# Altium footprint library jetson-nano-baseboard.PcbLib: 45 footprints (part 1 of 3)
Each footprint in its own frame and in the unit in brackets; x right, y up, seen from the top. Pads: shape width x height; smd on the part's side, far side on the other; paste and mask are expansions set on the pad; w line width, h text height; cw(c..) or ccw(c..) is an arc to the next point about the centre after c.
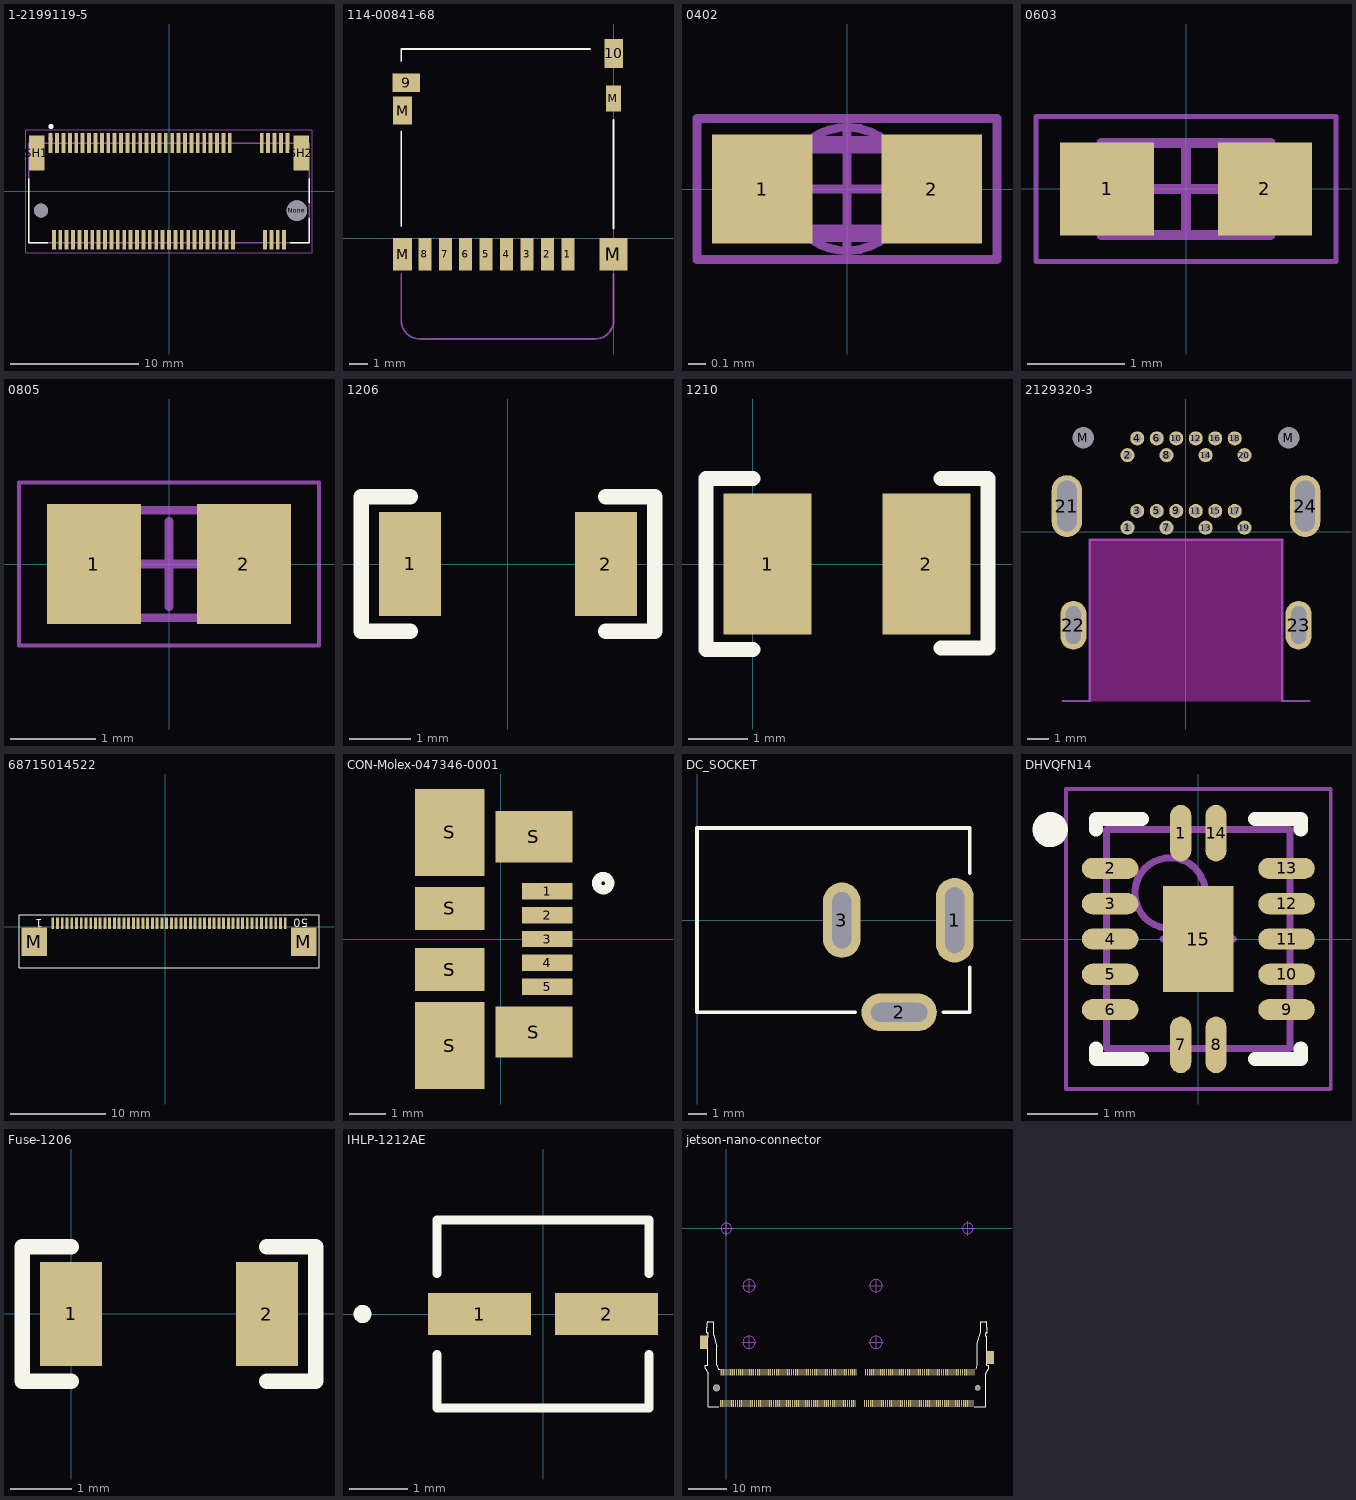
[diagram p0: the footprints below, top view; thin cyan lines are the x and y axes]

## 1-2199119-5 [mm]
pads (71):
  rect 0.3x1.55 smd: 1(-9.25,3.775) 2(-9,-3.775) 3(-8.75,3.775) 4(-8.5,-3.775) 5(-8.25,3.775) 6(-8,-3.775) 7(-7.75,3.775) 8(-7.5,-3.775) 9(-7.25,3.775) 10(-7,-3.775) 11(-6.75,3.775) 12(-6.5,-3.775) 13(-6.25,3.775) 14(-6,-3.775) 15(-5.75,3.775) 16(-5.5,-3.775) 17(-5.25,3.775) 18(-5,-3.775) 19(-4.75,3.775) 20(-4.5,-3.775) 21(-4.25,3.775) 22(-4,-3.775) 23(-3.75,3.775) 24(-3.5,-3.775) 25(-3.25,3.775) 26(-3,-3.775) 27(-2.75,3.775) 28(-2.5,-3.775) 29(-2.25,3.775) 30(-2,-3.775) 31(-1.75,3.775) 32(-1.5,-3.775) 33(-1.25,3.775) 34(-1,-3.775) 35(-0.75,3.775) 36(-0.5,-3.775) 37(-0.25,3.775) 38(0,-3.775) 39(0.25,3.775) 40(0.5,-3.775) 41(0.75,3.775) 42(1,-3.775) 43(1.25,3.775) 44(1.5,-3.775) 45(1.75,3.775) 46(2,-3.775) 47(2.25,3.775) 48(2.5,-3.775) 49(2.75,3.775) 50(3,-3.775) 51(3.25,3.775) 52(3.5,-3.775) 53(3.75,3.775) 54(4,-3.775) 55(4.25,3.775) 56(4.5,-3.775) 57(4.75,3.775) 58(5,-3.775) 67(7.25,3.775) 68(7.5,-3.775) 69(7.75,3.775) 70(8,-3.775) 71(8.25,3.775) 72(8.5,-3.775) 73(8.75,3.775) 74(9,-3.775) 75(9.25,3.775)
  round 1.1 hole 1.1 unplated: None(-10,-1.5)
  round 1.6 hole 1.6 unplated: None(10,-1.5)
  rect 1.2x2.75 smd: SH1(-10.35,3) SH2(10.35,3)
Top Overlay:
  circle w0.2: c-9.225,5.075 r0.1
  lines w0.127: -10.95,1 -10.95,-4 -9.5,-4 ; 9.5,-4 10.95,-4 10.95,-2.1 ; 10.95,-0.9 10.95,1
Mechanical 4:
  circle w0.2: c-9.25,4.115 r0.1
  circle w0.2: c-9.25,4.115 r0.1
  lines w0.127: -10.95,-4 -10.95,3.75 ; -10.95,-4 10.95,-4 ; -10.95,-4 -10.95,3.75 ; -10.95,-4 10.95,-4 ; -10.95,3.75 10.95,3.75 ; -10.95,3.75 10.95,3.75 ; 10.95,-4 10.95,3.75 ; 10.95,-4 10.95,3.75
Mechanical 16:
  lines w0.05: -11.2,-4.8 -11.2,4.8 11.2,4.8 11.2,-4.8 -11.2,-4.8
3D body: height 3.09, standoff -0.54, extent -10.97,-4.36 10.93,4.34

## 114-00841-68 [mm]
pads (14):
  rect 0.7x1.75 smd: 1(-2.455,-0.874) 2(-3.555,-0.874) 3(-4.655,-0.874) 4(-5.755,-0.874) 5(-6.855,-0.874) 6(-7.955,-0.874) 7(-9.055,-0.874) 8(-10.155,-0.874)
  rect 1.5x1 smd: 9(-11.155,8.365)
  rect 1x1.55 smd: 10(0.005,9.94)
  rect 1x1.75 smd: M(-11.355,-0.874)
  rect 1x1.5 smd: M(-11.355,6.865)
  rect 1.5x1.75 smd: M(-0.005,-0.874)
  rect 0.8x1.4 smd: M(-0.005,7.515)
Top Overlay:
  lines w0.1: -11.425,0.65 -11.425,5.73 ; -11.425,9.54 -11.425,10.175 -1.265,10.175 ; 0.005,0.523 0.005,6.365
Mechanical 3:
  lines w0.1: -11.425,-1.925 -11.425,-4.425 ccw(c-10.425,-4.425) -10.425,-5.425 -1,-5.425 ccw(c-1,-4.425) 0,-4.425 0,-1.925
  text "Micro SD Card" at -10.15,-4.075 h0.7
3D body: height 1.6, standoff 0, extent -11.628,-1.382 0.372,10.218

## 0402 [mm]
height 0.35
pads (2):
  rect 0.57x0.62 smd: 1(-0.48,0) 2(0.48,0)
Mechanical 3:
  circle w0.05: c0,0 r0.35
  lines w0.05: -0.5,0 0.5,0 ; 0,-0.4 0,0.4 ; -0.85,-0.4 -0.85,0.4 0.85,0.4 0.85,-0.4 -0.85,-0.4
Mechanical 13:
  lines w0.1: -0.5,-0.25 -0.5,0.25 0.5,0.25 0.5,-0.25 -0.5,-0.25
3D body: height 0.35, standoff 0, extent -0.472,-0.25 0.528,0.25

## 0603 [mm] "Chip Inductor Ferrite Bead 0603"
height 0.6
pads (2):
  rect 0.97x0.96 smd: 1(-0.815,0) 2(0.815,0)
Mechanical 13:
  lines w0.1: -0.875,-0.475 0.875,-0.475 0.875,0.475 -0.875,0.475 -0.875,-0.475
Mechanical 15:
  lines w0.05: -1.55,-0.75 1.55,-0.75 1.55,0.75 -1.55,0.75 -1.55,-0.75
  lines w0.1: -0.475,0 0.475,0 ; 0,-0.475 0,0.475
3D body: height 0.6, standoff 0, extent 0.475,-0.475 0.875,0.475
3D body: height 0.6, standoff 0, extent -0.875,-0.475 -0.475,0.475
3D body: height 0.6, standoff 0, extent -0.475,-0.475 0.475,0.475

## 0805 [mm]
pads (2):
  rect 1.1x1.4 smd: 1(-0.875,0) 2(0.875,0)
Mechanical 13:
  lines w0.1: -1,-0.625 1,-0.625 1,0.625 -1,0.625 -1,-0.625
Mechanical 15:
  lines w0.05: -1.75,-0.95 1.75,-0.95 1.75,0.95 -1.75,0.95 -1.75,-0.95
  lines w0.1: -0.5,0 0.5,0 ; 0,-0.5 0,0.5
3D body: height 0.45, standoff 0, extent 1,-0.625 1,0.625
3D body: height 0.45, standoff 0, extent -1,-0.625 -1,0.625
3D body: height 0.78, standoff 0, extent -1,-0.625 1,0.625

## 1206 [mm]
pads (2):
  rect 1.016x1.7 smd: 1(-1.6,0) 2(1.6,0)
Top Overlay:
  lines w0.254: -1.6,-1.1 -2.4,-1.1 -2.4,1.1 -1.6,1.1 ; 1.6,-1.1 2.4,-1.1 2.4,1.1 1.6,1.1
3D body: height 0.61, standoff -0.01, extent -1.627,-0.787 1.577,0.838

## 1210 [mm]
pads (2):
  rect 1.5x2.4 smd: 1(0.25,0) 2(2.95,0)
Top Overlay:
  lines w0.254: 0,-1.45 -0.8,-1.45 -0.8,1.45 0,1.45 ; 3.2,-1.425 4,-1.425 4,1.45 3.2,1.45
3D body: height 1.3, standoff -1.3, extent -0.125,-0.75 3.275,0.75

## 2129320-3 [mm]
pads (26):
  round 0.65 hole 0.4 unplated: 1(-2.7,0.175) 2(-2.7,3.525) 3(-2.25,0.95) 4(-2.25,4.3) 5(-1.35,0.95) 6(-1.35,4.3) 7(-0.9,0.175) 8(-0.9,3.525) 9(-0.45,0.95) 10(-0.45,4.3) 11(0.45,0.95) 12(0.45,4.3) 13(0.908,0.175) 14(0.908,3.525) 15(1.35,0.95) 16(1.35,4.3) 17(2.25,0.95) 18(2.25,4.3) 19(2.7,0.175) 20(2.7,3.525)
  oval 1.4x2.85 hole 0.9 slot 2.35 at 90 deg: 21(-5.5,1.175) 24(5.5,1.175)
  oval 1.2x2.25 hole 0.7 slot 1.74 at 90 deg: 22(-5.2,-4.325) 23(5.2,-4.325)
  round 0.75 hole 1: M(-4.75,4.325) M(4.75,4.325)
Keep-Out Layer:
  board cut-out: -4.445,-0.381 4.445,-0.381 4.445,-7.825 -4.445,-7.825
Mechanical 1:
  lines w0.1: -5.7,-7.825 -5.2,-7.825 -4.445,-7.825 -4.445,-0.381 4.445,-0.381 4.445,-7.825 5.2,-7.825 5.7,-7.825
  text "PCB edge" at -2.921,-9.144 h0.76
3D body: height 4.18, standoff -2.22, extent -5.7,-7.825 5.7,4.825

## 68715014522 [mm] "50 pins"
height 2.1
pads (52):
  rect 0.3x1.2 smd: 1(-11.865,0.381) 2(-11.365,0.381) 3(-10.865,0.381) 4(-10.365,0.381) 5(-9.865,0.381) 6(-9.365,0.381) 7(-8.865,0.381) 8(-8.365,0.381) 9(-7.865,0.381) 10(-7.365,0.381) 11(-6.865,0.381) 12(-6.365,0.381) 13(-5.865,0.381) 14(-5.365,0.381) 15(-4.865,0.381) 16(-4.365,0.381) 17(-3.865,0.381) 18(-3.365,0.381) 19(-2.865,0.381) 20(-2.365,0.381) 21(-1.865,0.381) 22(-1.365,0.381) 23(-0.865,0.381) 24(-0.365,0.381) 25(0.135,0.381) 26(0.635,0.381) 27(1.135,0.381) 28(1.635,0.381) 29(2.135,0.381) 30(2.635,0.381) 31(3.135,0.381) 32(3.635,0.381) 33(4.135,0.381) 34(4.635,0.381) 35(5.135,0.381) 36(5.635,0.381) 37(6.135,0.381) 38(6.635,0.381) 39(7.135,0.381) 40(7.635,0.381) 41(8.135,0.381) 42(8.635,0.381) 43(9.135,0.381) 44(9.635,0.381) 45(10.135,0.381) 46(10.635,0.381) 47(11.135,0.381) 48(11.635,0.381) 49(12.135,0.381) 50(12.635,0.381)
  rect 2.7x3 smd: M(-13.795,-1.599) M(14.565,-1.599)
Top Overlay:
  lines w0.127: -15.415,-4.319 -15.415,1.281 16.185,1.281 16.185,-4.319 -15.415,-4.319
  text "1" at -12.919,0.775 h0.9
  text "50" at 15.072,0.826 h0.9
3D body: height 2.06, standoff -0.04, extent -15.319,-4.324 16.081,0.776

## CON-Molex-047346-0001 [mm]
pads (11):
  rect 1.38x0.45 smd: 1(1.263,1.3) 2(1.263,0.65) 3(1.263,0) 4(1.263,-0.65) 5(1.263,-1.3)
  rect 1.9x2.37 smd: S(-1.397,-2.91) S(-1.397,2.91)
  rect 1.9x1.175 smd: S(-1.397,-0.837) S(-1.397,0.837)
  rect 2.1x1.4 smd: S(0.903,-2.54) S(0.903,2.794)
Top Overlay:
  circle w0.254: c2.794,1.524 r0.18
3D body: height 2.71, standoff -0.23, extent -3.796,-3.99 1.634,3.99

## DC_SOCKET [mm]
height 11
pads (3):
  oval 2x4.5 hole 1 slot 3.5 at 90 deg: 1(13.7,0)
  oval 4x2 hole 1 slot 3 at 0 deg: 2(10.75,-4.9)
  oval 2x4 hole 1 slot 3 at 90 deg: 3(7.7,0)
Top Overlay:
  lines w0.2: 8.4,-4.9 0,-4.9 0,4.9 14.5,4.9 14.5,2.5 ; 13.1,-4.9 14.5,-4.9 14.5,-2.5
3D body: height 11.01, standoff -3.49, extent 0,-5.1 14.1,4.5

## DHVQFN14 [mm] "QFN, 14-Leads, Body 2.50x3.00mm, Pitch 0.50mm, Thermal Pad 1.00x1.50mm, IPC Medium Density"
height 1
pads (15):
  oval 0.3x0.8 smd: 1(-0.25,1.5) 7(-0.25,-1.5) 8(0.25,-1.5) 14(0.25,1.5)
  oval 0.8x0.3 smd: 2(-1.25,1) 3(-1.25,0.5) 4(-1.25,0) 5(-1.25,-0.5) 6(-1.25,-1) 9(1.25,-1) 10(1.25,-0.5) 11(1.25,0) 12(1.25,0.5) 13(1.25,1)
  rect 1x1.5 smd: 15(0,0)
Top Overlay:
  circle w0.25: c-2.1,1.55 r0.125
  lines w0.2: -1.45,-1.55 -1.45,-1.7 -0.8,-1.7 ; -1.45,1.55 -1.45,1.7 -0.8,1.7 ; 0.8,-1.7 1.45,-1.7 1.45,-1.55 ; 0.8,1.7 1.45,1.7 1.45,1.55
Mechanical 13:
  circle w0.1: c-0.4,0.65 r0.5
  lines w0.1: -1.3,-1.55 -1.3,1.55 1.3,1.55 1.3,-1.55 -1.3,-1.55
Mechanical 15:
  lines w0.05: -1.875,-2.125 -1.875,2.125 1.875,2.125 1.875,-2.125 -1.875,-2.125
  lines w0.1: -0.5,0 0.5,0 ; 0,-0.5 0,0.5
3D body: height 0.85, standoff -0.02, extent -1.252,-1.501 1.25,1.501

## Fuse-1206 [mm]
pads (2):
  rect 1.016x1.7 smd: 1(0,0) 2(3.2,0)
Top Overlay:
  lines w0.254: 0,-1.1 -0.8,-1.1 -0.8,1.1 0,1.1 ; 3.2,-1.1 4,-1.1 4,1.1 3.2,1.1
3D body: height 1.43, standoff -0.03, extent -0.026,-0.825 3.176,0.827

## IHLP-1212AE [mil]
pads (2):
  rect 69x28 smd: 1(-42.5,0) 2(42.5,0)
Top Overlay:
  circle w6: c-121,0 r3
  lines w6: -71,-27.1 -71,-63 71,-63 71,-27.1 ; -71,27.1 -71,63 71,63 71,27.1
3D body: height 61, standoff 0, extent -71,-63 71,63

## jetson-nano-connector [mm]
pads (264):
  rect 0.3x1.75 smd: 1(-1.575,-46.1) 2(-1.325,-37.9) 3(-1.075,-46.1) 4(-0.825,-37.9) 5(-0.575,-46.1) 6(-0.325,-37.9) 7(-0.075,-46.1) 8(0.175,-37.9) 9(0.425,-46.1) 10(0.675,-37.9) 11(0.925,-46.1) 12(1.175,-37.9) 13(1.425,-46.1) 14(1.675,-37.9) 15(1.925,-46.1) 16(2.175,-37.9) 17(2.425,-46.1) 18(2.675,-37.9) 19(2.925,-46.1) 20(3.175,-37.9) 21(3.425,-46.1) 22(3.675,-37.9) 23(3.925,-46.1) 24(4.175,-37.9) 25(4.425,-46.1) 26(4.675,-37.9) 27(4.925,-46.1) 28(5.175,-37.9) 29(5.425,-46.1) 30(5.675,-37.9) 31(5.925,-46.1) 32(6.175,-37.9) 33(6.425,-46.1) 34(6.675,-37.9) 35(6.925,-46.1) 36(7.175,-37.9) 37(7.425,-46.1) 38(7.675,-37.9) 39(7.925,-46.1) 40(8.175,-37.9) 41(8.425,-46.1) 42(8.675,-37.9) 43(8.925,-46.1) 44(9.175,-37.9) 45(9.425,-46.1) 46(9.675,-37.9) 47(9.925,-46.1) 48(10.175,-37.9) 49(10.425,-46.1) 50(10.675,-37.9) 51(10.925,-46.1) 52(11.175,-37.9) 53(11.425,-46.1) 54(11.675,-37.9) 55(11.925,-46.1) 56(12.175,-37.9) 57(12.425,-46.1) 58(12.675,-37.9) 59(12.925,-46.1) 60(13.175,-37.9) 61(13.425,-46.1) 62(13.675,-37.9) 63(13.925,-46.1) 64(14.175,-37.9) 65(14.425,-46.1) 66(14.675,-37.9) 67(14.925,-46.1) 68(15.175,-37.9) 69(15.425,-46.1) 70(15.675,-37.9) 71(15.925,-46.1) 72(16.175,-37.9) 73(16.425,-46.1) 74(16.675,-37.9) 75(16.925,-46.1) 76(17.175,-37.9) 77(17.425,-46.1) 78(17.675,-37.9) 79(17.925,-46.1) 80(18.175,-37.9) 81(18.425,-46.1) 82(18.675,-37.9) 83(18.925,-46.1) 84(19.175,-37.9) 85(19.425,-46.1) 86(19.675,-37.9) 87(19.925,-46.1) 88(20.175,-37.9) 89(20.425,-46.1) 90(20.675,-37.9) 91(20.925,-46.1) 92(21.175,-37.9) 93(21.425,-46.1) 94(21.675,-37.9) 95(21.925,-46.1) 96(22.175,-37.9) 97(22.425,-46.1) 98(22.675,-37.9) 99(22.925,-46.1) 100(23.175,-37.9) 101(23.425,-46.1) 102(23.675,-37.9) 103(23.925,-46.1) 104(24.175,-37.9) 105(24.425,-46.1) 106(24.675,-37.9) 107(24.925,-46.1) 108(25.175,-37.9) 109(25.425,-46.1) 110(25.675,-37.9) 111(25.925,-46.1) 112(26.175,-37.9) 113(26.425,-46.1) 114(26.675,-37.9) 115(26.925,-46.1) 116(27.175,-37.9) 117(27.425,-46.1) 118(27.675,-37.9) 119(27.925,-46.1) 120(28.175,-37.9) 121(28.425,-46.1) 122(28.675,-37.9) 123(28.925,-46.1) 124(29.175,-37.9) 125(29.425,-46.1) 126(29.675,-37.9) 127(29.925,-46.1) 128(30.175,-37.9) 129(30.425,-46.1) 130(30.675,-37.9) 131(30.925,-46.1) 132(31.175,-37.9) 133(31.425,-46.1) 134(31.675,-37.9) 135(31.925,-46.1) 136(32.175,-37.9) 137(32.425,-46.1) 138(32.675,-37.9) 139(32.925,-46.1) 140(33.175,-37.9) 141(33.425,-46.1) 142(33.675,-37.9) 143(33.925,-46.1) 144(34.175,-37.9) 145(36.425,-46.1) 146(36.675,-37.9) 147(36.925,-46.1) 148(37.175,-37.9) 149(37.425,-46.1) 150(37.675,-37.9) 151(37.925,-46.1) 152(38.175,-37.9) 153(38.425,-46.1) 154(38.675,-37.9) 155(38.925,-46.1) 156(39.175,-37.9) 157(39.425,-46.1) 158(39.675,-37.9) 159(39.925,-46.1) 160(40.175,-37.9) 161(40.425,-46.1) 162(40.675,-37.9) 163(40.925,-46.1) 164(41.175,-37.9) 165(41.425,-46.1) 166(41.675,-37.9) 167(41.925,-46.1) 168(42.175,-37.9) 169(42.425,-46.1) 170(42.675,-37.9) 171(42.925,-46.1) 172(43.175,-37.9) 173(43.425,-46.1) 174(43.675,-37.9) 175(43.925,-46.1) 176(44.175,-37.9) 177(44.425,-46.1) 178(44.675,-37.9) 179(44.925,-46.1) 180(45.175,-37.9) 181(45.425,-46.1) 182(45.675,-37.9) 183(45.925,-46.1) 184(46.175,-37.9) 185(46.425,-46.1) 186(46.675,-37.9) 187(46.925,-46.1) 188(47.175,-37.9) 189(47.425,-46.1) 190(47.675,-37.9) 191(47.925,-46.1) 192(48.175,-37.9) 193(48.425,-46.1) 194(48.675,-37.9) 195(48.925,-46.1) 196(49.175,-37.9) 197(49.425,-46.1) 198(49.675,-37.9) 199(49.925,-46.1) 200(50.175,-37.9) 201(50.425,-46.1) 202(50.675,-37.9) 203(50.925,-46.1) 204(51.175,-37.9) 205(51.425,-46.1) 206(51.675,-37.9) 207(51.925,-46.1) 208(52.175,-37.9) 209(52.425,-46.1) 210(52.675,-37.9) 211(52.925,-46.1) 212(53.175,-37.9) 213(53.425,-46.1) 214(53.675,-37.9) 215(53.925,-46.1) 216(54.175,-37.9) 217(54.425,-46.1) 218(54.675,-37.9) 219(54.925,-46.1) 220(55.175,-37.9) 221(55.425,-46.1) 222(55.675,-37.9) 223(55.925,-46.1) 224(56.175,-37.9) 225(56.425,-46.1) 226(56.675,-37.9) 227(56.925,-46.1) 228(57.175,-37.9) 229(57.425,-46.1) 230(57.675,-37.9) 231(57.925,-46.1) 232(58.175,-37.9) 233(58.425,-46.1) 234(58.675,-37.9) 235(58.925,-46.1) 236(59.175,-37.9) 237(59.425,-46.1) 238(59.675,-37.9) 239(59.925,-46.1) 240(60.175,-37.9) 241(60.425,-46.1) 242(60.675,-37.9) 243(60.925,-46.1) 244(61.175,-37.9) 245(61.425,-46.1) 246(61.675,-37.9) 247(61.925,-46.1) 248(62.175,-37.9) 249(62.425,-46.1) 250(62.675,-37.9) 251(62.925,-46.1) 252(63.175,-37.9) 253(63.425,-46.1) 254(63.675,-37.9) 255(63.925,-46.1) 256(64.175,-37.9) 257(64.425,-46.1) 258(64.675,-37.9) 259(64.925,-46.1) 260(65.175,-37.9)
  rect 2x3.5 smd: 261(69.525,-34) 262(-5.975,-30)
  round 1.9 hole 1.6 unplated: M(-2.6,-42)
  round 1.5 hole 1.1 unplated: M(66.2,-42)
Top Overlay:
  lines w0.1: -4.954,-28.6 -4.954,-36 -5.5,-36.05 ; -4.878,-28.6 ccw(c-4.878,-28.45) -4.728,-28.45 -4.728,-27.667 ccw(c-4.878,-27.667) -4.878,-27.517 -5.127,-27.517 -5.127,-26.028 -4.978,-26.028 -4.978,-24.813 cw(c-4.778,-24.813) -4.778,-24.613 -3.871,-24.613 -3.871,-24.61 -3.371,-24.61 -3.371,-28.128 -2.5,-31.166 -2.5,-36.05 -2.15,-37.15 -1.65,-37.15 ; 65.85,-37.15 66.1,-36.05 ; -5.5,-36.813 ccw(c-5,-36.813) -5.43,-37.068 ; -5.5,-36.813 ccw(c-5,-36.813) -5.43,-37.068 ; -5.5,-36.813 -5.5,-36.05 ; -5.5,-36.813 -5.5,-36.05 ; -5.43,-37.068 -4.77,-38.182 ; -5.43,-37.068 -4.77,-38.182 ; -4.77,-38.182 cw(c-5.2,-38.437) -4.7,-38.437 ; -4.77,-38.182 cw(c-5.2,-38.437) -4.7,-38.437 ; -4.7,-47 -4.7,-38.437 ; -4.7,-47 -4.7,-38.437 ; -4.7,-47 -1.95,-47 -4.7,-47 ; 66.1,-36.05 66.1,-30.318 ; 66.1,-36.05 66.1,-30.318 ; 66.1,-30.318 66.98,-27.318 66.98,-24.595 67.59,-24.595 ccw(c67.63,-24.45) 67.63,-24.6 68.35,-24.6 cw(c68.35,-24.8) 68.55,-24.8 68.55,-26 68.736,-26 68.736,-27.5 68.5,-27.5 ccw(c68.5,-27.7) 68.3,-27.7 68.3,-28.3 ccw(c68.5,-28.3) 68.5,-28.5 68.545,-28.5 68.545,-36 69.1,-36.05 ; 68.3,-47 68.3,-38.437 ; 68.3,-47 65.3,-47 68.3,-47 ; 68.3,-47 68.3,-38.437 ; 68.3,-38.437 cw(c68.8,-38.437) 68.37,-38.182 ; 68.3,-38.437 cw(c68.8,-38.437) 68.37,-38.182 ; 68.37,-38.182 69.03,-37.068 ; 68.37,-38.182 69.03,-37.068 ; 69.03,-37.068 ccw(c68.6,-36.813) 69.1,-36.813 ; 69.03,-37.068 ccw(c68.6,-36.813) 69.1,-36.813 ; 69.1,-36.813 69.1,-36.05 ; 69.1,-36.813 69.1,-36.05
Mechanical 3:
  circle w0.1: c0,0 r1.375
  circle w0.1: c5.987,-30.002 r1.6
  circle w0.1: c5.987,-15.098 r1.6
  circle w0.1: c39.413,-15.098 r1.6
  circle w0.1: c39.413,-30.002 r1.6
  circle w0.1: c63.6,0 r1.375
  lines w0.1: -1.9,0 0,0 ; 0,-1.9 0,0 ; 0,1.9 0,0 ; 1.9,0 0,0 ; 4.094,-29.997 5.994,-29.997 ; 4.094,-15.088 5.994,-15.088 ; 5.994,-31.897 5.994,-29.997 ; 5.994,-28.097 5.994,-29.997 ; 5.994,-16.988 5.994,-15.088 ; 5.994,-13.188 5.994,-15.088 ; 7.894,-29.997 5.994,-29.997 ; 7.894,-15.088 5.994,-15.088 ; 37.521,-29.997 39.421,-29.997 ; 37.521,-15.113 39.421,-15.113 ; 39.421,-31.897 39.421,-29.997 ; 39.421,-28.097 39.421,-29.997 ; 39.421,-17.013 39.421,-15.113 ; 39.421,-13.213 39.421,-15.113 ; 41.321,-29.997 39.421,-29.997 ; 41.321,-15.113 39.421,-15.113 ; 61.702,0 63.602,0 ; 63.602,-1.9 63.602,0 ; 63.602,1.9 63.602,0 ; 65.502,0 63.602,0
  text "module mounting holes placement taken from 3D models" at 12.125,-0.125 h0.76
  text "its real position may differ" at 21.15,-1.2 h0.76
3D body: height 9.23, standoff -0.42, extent -6.275,-46.9 69.824,-21.05

## jetson-nano-module [mm]
height 13.55
3D body: height 10.73, standoff 5.48, extent -3,-42 66.6,3